# Altium footprint library 1.01-电阻.PcbLib: 78 footprints (part 2 of 5)
Each footprint in its own frame and in the unit in brackets; x right, y up, seen from the top. Pads: shape width x height; smd on the part's side, far side on the other; paste and mask are expansions set on the pad; w line width, h text height; cw(c..) or ccw(c..) is an arc to the next point about the centre after c.
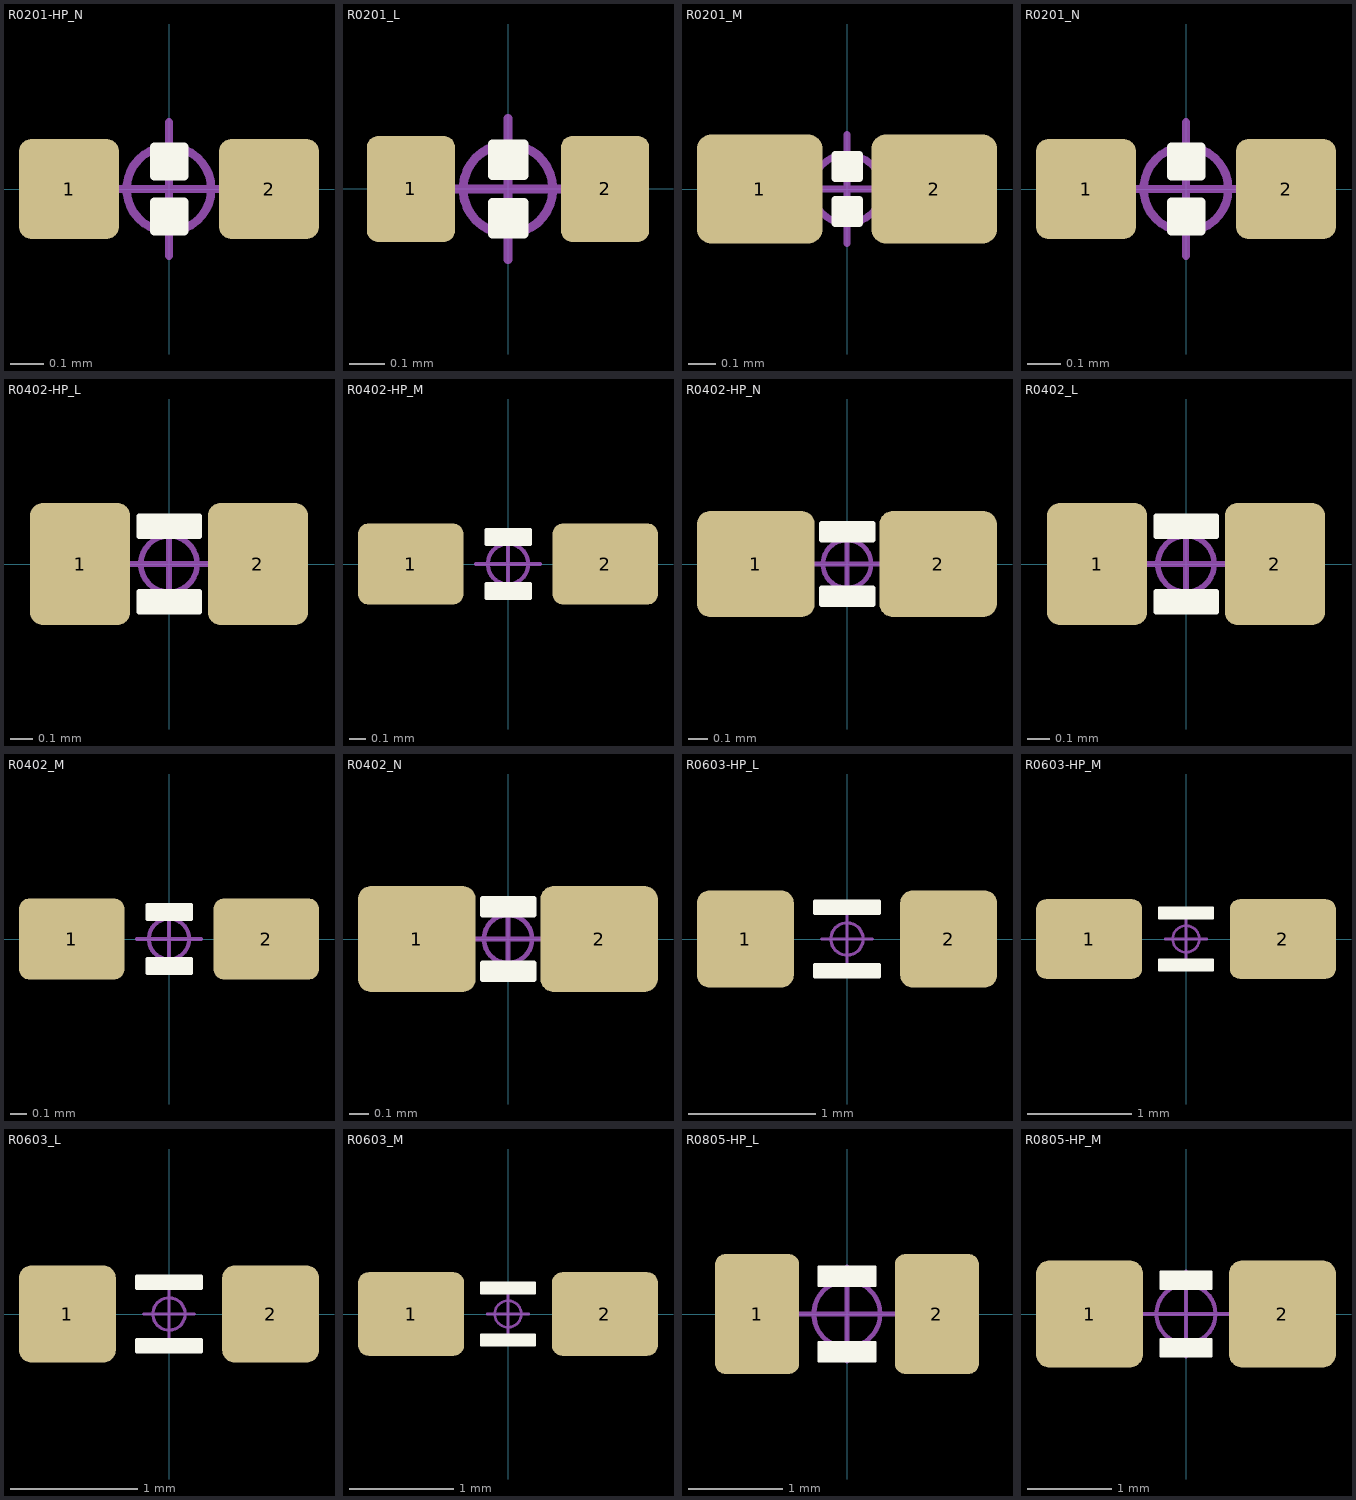
[diagram p1: the footprints below, top view; thin cyan lines are the x and y axes]

## R0201-HP_N [mm] "1/20W高精度贴片电阻"
pads (2):
  rrect25% 0.3x0.3 smd: 1(-0.3,0) 2(0.3,0)
Top Overlay:
  region: -0.044,-0.127 -0.044,-0.038 0.045,-0.038 0.045,-0.127
  region: -0.044,0.038 -0.044,0.127 0.045,0.127 0.045,0.038
  lines w0.025: -0.044,-0.127 0.045,-0.127 0.045,-0.038 -0.044,-0.038 -0.044,-0.127 ; -0.044,0.038 0.045,0.038 0.045,0.127 -0.044,0.127 -0.044,0.038
Mechanical 15:
  circle w0.025: c0,0 r0.127
  lines w0.025: -0.2,0 0.2,0 ; 0,-0.2 0,0.2
3D body "R0201-HP.STEP": height 0.23, standoff 0, extent -0.3,-0.15 0.3,0.15

## R0201_L [mm] "1/20W贴片电阻"
pads (2):
  rrect25% 0.25x0.3 smd: 1(-0.275,0) 2(0.275,0)
Top Overlay:
  region: -0.044,0.038 -0.044,0.127 0.045,0.127 0.045,0.038
  region: -0.044,-0.127 -0.044,-0.038 0.045,-0.038 0.045,-0.127
  lines w0.025: -0.044,-0.127 -0.044,-0.038 0.045,-0.038 0.045,-0.127 -0.044,-0.127 ; -0.044,0.038 -0.044,0.127 0.045,0.127 0.045,0.038 -0.044,0.038
Mechanical 15:
  circle w0.025: c0,0 r0.127
  lines w0.025: -0.2,0 0.2,0 ; 0,-0.2 0,0.2
3D body "R0201.STEP": height 0.26, standoff 0.03, extent -0.3,-0.152 0.3,0.148

## R0201_M [mm] "1/20W贴片电阻"
pads (2):
  rrect25% 0.46x0.4 smd: 1(-0.32,0) 2(0.32,0)
Top Overlay:
  region: -0.044,0.038 -0.044,0.127 0.045,0.127 0.045,0.038
  region: -0.044,-0.127 -0.044,-0.038 0.045,-0.038 0.045,-0.127
  lines w0.025: -0.044,-0.127 -0.044,-0.038 0.045,-0.038 0.045,-0.127 -0.044,-0.127 ; -0.044,0.038 -0.044,0.127 0.045,0.127 0.045,0.038 -0.044,0.038
Mechanical 15:
  circle w0.025: c0,0 r0.127
  lines w0.025: -0.2,0 0.2,0 ; 0,-0.2 0,0.2
3D body "R0201.STEP": height 0.26, standoff 0.03, extent -0.3,-0.15 0.3,0.15

## R0201_N [mm] "1/20W贴片电阻"
pads (2):
  rrect25% 0.3x0.3 smd: 1(-0.3,0) 2(0.3,0)
Top Overlay:
  region: -0.044,0.038 -0.044,0.127 0.045,0.127 0.045,0.038
  region: -0.044,-0.127 -0.044,-0.038 0.045,-0.038 0.045,-0.127
  lines w0.025: -0.044,-0.127 -0.044,-0.038 0.045,-0.038 0.045,-0.127 -0.044,-0.127 ; -0.044,0.038 -0.044,0.127 0.045,0.127 0.045,0.038 -0.044,0.038
Mechanical 15:
  circle w0.025: c0,0 r0.127
  lines w0.025: -0.2,0 0.2,0 ; 0,-0.2 0,0.2
3D body "R0201.STEP": height 0.26, standoff 0.03, extent -0.3,-0.15 0.3,0.15

## R0402-HP_L [mm] "1/16W高精度贴片电阻"
pads (2):
  rrect25% 0.45x0.55 smd: 1(-0.4,0) 2(0.4,0)
Top Overlay:
  region: -0.134,-0.214 -0.134,-0.125 0.136,-0.125 0.136,-0.214
  region: -0.134,0.125 0.136,0.125 0.136,0.214 -0.134,0.214
  lines w0.025: -0.134,-0.214 -0.134,-0.125 0.136,-0.125 0.136,-0.214 -0.134,-0.214 ; -0.134,0.125 0.136,0.125 0.136,0.214 -0.134,0.214 -0.134,0.125
Mechanical 15:
  circle w0.025: c0,0 r0.127
  lines w0.025: -0.2,0 0.2,0 ; 0,-0.2 0,0.2
3D body "R0402-HP.STEP": height 0.3, standoff 0, extent -0.5,-0.25 0.5,0.25

## R0402-HP_M [mil] "1/16W高精度贴片电阻"
pads (2):
  rrect25% 26x20 smd: 1(-24,0) 2(24,0)
Top Overlay:
  region: -5.28,-8.44 -5.28,-4.94 5.37,-4.94 5.37,-8.44
  region: -5.28,4.94 5.37,4.94 5.37,8.44 -5.28,8.44
  lines w1: -5.28,-8.44 -5.28,-4.94 5.37,-4.94 5.37,-8.44 -5.28,-8.44 ; -5.28,4.94 5.37,4.94 5.37,8.44 -5.28,8.44 -5.28,4.94
Mechanical 15:
  circle w1: c0,0 r5
  lines w1: -7.87,0 7.87,0 ; 0,-7.87 0,7.87
3D body "R0402-HP.STEP": height 11.85, standoff 0, extent -19.68,-9.84 19.69,9.85

## R0402-HP_N [mm] "1/16W高精度贴片电阻"
pads (2):
  rrect25% 0.62x0.56 smd: 1(-0.48,0)
  rrect26% 0.62x0.56 smd: 2(0.48,0)
Top Overlay:
  region: -0.134,0.125 0.136,0.125 0.136,0.214 -0.134,0.214
  region: -0.134,-0.214 -0.134,-0.125 0.136,-0.125 0.136,-0.214
  lines w0.025: -0.134,-0.214 0.136,-0.214 0.136,-0.125 -0.134,-0.125 -0.134,-0.214 ; -0.134,0.125 -0.134,0.214 0.136,0.214 0.136,0.125 -0.134,0.125
Mechanical 15:
  circle w0.025: c0,0 r0.127
  lines w0.025: -0.2,0 0.2,0 ; 0,-0.2 0,0.2
3D body "R0402-HP.STEP": height 0.3, standoff 0, extent -0.5,-0.25 0.5,0.25

## R0402_L [mm] "1/16W贴片电阻"
pads (2):
  rrect25% 0.45x0.55 smd: 1(-0.4,0) 2(0.4,0)
Top Overlay:
  region: -0.134,-0.214 -0.134,-0.125 0.136,-0.125 0.136,-0.214
  region: -0.134,0.125 0.136,0.125 0.136,0.214 -0.134,0.214
  lines w0.025: -0.134,-0.214 -0.134,-0.125 0.136,-0.125 0.136,-0.214 -0.134,-0.214 ; -0.134,0.125 0.136,0.125 0.136,0.214 -0.134,0.214 -0.134,0.125
Mechanical 15:
  circle w0.025: c0,0 r0.127
  lines w0.025: -0.2,0 0.2,0 ; 0,-0.2 0,0.2
3D body "R0402.STEP": height 0.3, standoff 0, extent -0.5,-0.25 0.5,0.25

## R0402_M [mil] "1/16W贴片电阻"
pads (2):
  rrect25% 26x20 smd: 1(-24,0) 2(24,0)
Top Overlay:
  region: -5.28,-8.44 -5.28,-4.94 5.37,-4.94 5.37,-8.44
  region: -5.28,4.94 5.37,4.94 5.37,8.44 -5.28,8.44
  lines w1: -5.28,-8.44 -5.28,-4.94 5.37,-4.94 5.37,-8.44 -5.28,-8.44 ; -5.28,4.94 5.37,4.94 5.37,8.44 -5.28,8.44 -5.28,4.94
Mechanical 15:
  circle w1: c0,0 r5
  lines w1: -7.87,0 7.87,0 ; 0,-7.87 0,7.87
3D body "R0402.STEP": height 11.85, standoff 0, extent -19.68,-9.84 19.69,9.85

## R0402_N [mm] "1/16W贴片电阻"
pads (2):
  rrect25% 0.62x0.56 smd: 1(-0.48,0)
  rrect26% 0.62x0.56 smd: 2(0.48,0)
Top Overlay:
  region: -0.134,0.125 0.136,0.125 0.136,0.214 -0.134,0.214
  region: -0.134,-0.214 -0.134,-0.125 0.136,-0.125 0.136,-0.214
  lines w0.025: -0.134,-0.214 0.136,-0.214 0.136,-0.125 -0.134,-0.125 -0.134,-0.214 ; -0.134,0.125 -0.134,0.214 0.136,0.214 0.136,0.125 -0.134,0.125
Mechanical 15:
  circle w0.025: c0,0 r0.127
  lines w0.025: -0.2,0 0.2,0 ; 0,-0.2 0,0.2
3D body "R0402.STEP": height 0.3, standoff 0, extent -0.5,-0.25 0.5,0.25

## R0603-HP_L [mil] "1/10W高精度贴片电阻"
pads (2):
  rrect25% 30x30 smd: 1(-31.5,0) 2(31.5,0)
Top Overlay:
  region: -10.07,7.87 10.07,7.87 10.07,11.81 -10.07,11.81
  region: -10.07,-11.81 10.07,-11.81 10.07,-7.87 -10.07,-7.87
  lines w1: -10.07,-11.81 -10.07,-7.87 0,-7.87 10.07,-7.87 10.07,-11.81 0,-11.81 -10.07,-11.81 ; -10.07,7.87 0,7.87 10.07,7.87 10.07,11.81 0,11.81 -10.07,11.81 -10.07,7.87
Mechanical 15:
  circle w1: c0,0 r5
  lines w1: -7.87,0 7.87,0 ; 0,-7.87 0,7.87
3D body "R0603-HP.STEP": height 15.79, standoff 0, extent -31.49,-15.74 31.5,15.75

## R0603-HP_M [mil] "1/10W高精度贴片电阻"
pads (2):
  rrect25% 40x30 smd: 1(-36.5,0) 2(36.5,0)
Top Overlay:
  region: -10.07,-11.81 10.07,-11.81 10.07,-7.87 -10.07,-7.87
  region: -10.07,7.87 10.07,7.87 10.07,11.81 -10.07,11.81
  lines w1: -10.07,-11.81 0,-11.81 10.07,-11.81 10.07,-7.87 0,-7.87 -10.07,-7.87 -10.07,-11.81 ; -10.07,7.87 -10.07,11.81 0,11.81 10.07,11.81 10.07,7.87 0,7.87 -10.07,7.87
Mechanical 15:
  circle w1: c0,0 r5
  lines w1: -7.87,0 7.87,0 ; 0,-7.87 0,7.87
3D body "R0603-HP.STEP": height 15.79, standoff 0, extent -31.49,-15.74 31.5,15.75

## R0603_L [mil] "1/10W贴片电阻"
pads (2):
  rrect25% 30x30 smd: 1(-31.5,0) 2(31.5,0)
Top Overlay:
  region: -10.07,-11.81 10.07,-11.81 10.07,-7.87 -10.07,-7.87
  region: -10.07,7.87 10.07,7.87 10.07,11.81 -10.07,11.81
  lines w1: -10.07,-11.81 0,-11.81 10.07,-11.81 10.07,-7.87 0,-7.87 -10.07,-7.87 -10.07,-11.81 ; -10.07,7.87 -10.07,11.81 0,11.81 10.07,11.81 10.07,7.87 0,7.87 -10.07,7.87
Mechanical 15:
  circle w1: c0,0 r5
  lines w1: -7.87,0 7.87,0 ; 0,-7.87 0,7.87
3D body "R0603.STEP": height 15.79, standoff 0, extent -31.49,-15.74 31.5,15.75

## R0603_M [mil] "1/10W贴片电阻"
pads (2):
  rrect25% 40x31.5 smd: 1(-36.5,0) 2(36.5,0)
Top Overlay:
  region: -10.07,-11.81 10.07,-11.81 10.07,-7.87 -10.07,-7.87
  region: -10.07,7.87 10.07,7.87 10.07,11.81 -10.07,11.81
  lines w1: -10.07,-11.81 0,-11.81 10.07,-11.81 10.07,-7.87 0,-7.87 -10.07,-7.87 -10.07,-11.81 ; -10.07,7.87 -10.07,11.81 0,11.81 10.07,11.81 10.07,7.87 0,7.87 -10.07,7.87
Mechanical 15:
  circle w1: c0,0 r5
  lines w1: -7.87,0 7.87,0 ; 0,-7.87 0,7.87
3D body "R0603.STEP": height 15.79, standoff 0, extent -31.49,-15.74 31.5,15.75

## R0805-HP_L [mm] "1/8W高精度贴片电阻"
pads (2):
  rrect25% 0.889x1.27 smd: 1(-0.95,0) 2(0.95,0)
Top Overlay:
  region: 0.3,0.5 0.3,0.3 -0.3,0.3 -0.3,0.5
  region: -0.3,-0.5 -0.3,-0.3 0.3,-0.3 0.3,-0.5
  lines w0.025: -0.3,-0.5 -0.3,-0.3 0.1,-0.3 0.3,-0.3 0.3,-0.5 0,-0.5 -0.3,-0.5 ; -0.3,0.3 -0.1,0.3 0.3,0.3 0.3,0.5 0,0.5 -0.3,0.5 -0.3,0.3
Mechanical 15:
  circle w0.05: c0,0 r0.35
  lines w0.05: -0.5,0 0.5,0 ; 0,-0.5 0,0.5
3D body "R0805-HP.STEP": height 0.53, standoff 0.03, extent -1,-0.625 1,0.625

## R0805-HP_M [mil] "1/8W高精度贴片电阻"
pads (2):
  rrect25% 50x50 smd: 1(-45,0) 2(45,0)
Top Overlay:
  region: 11.81,19.68 11.81,11.81 -11.81,11.81 -11.81,19.68
  region: -11.81,-19.68 -11.81,-11.81 11.81,-11.81 11.81,-19.68
  lines w1: -11.81,-19.68 -11.81,-11.81 3.94,-11.81 11.81,-11.81 11.81,-19.68 0,-19.68 -11.81,-19.68 ; -11.81,11.81 -3.94,11.81 11.81,11.81 11.81,19.68 0,19.68 -11.81,19.68 -11.81,11.81
Mechanical 15:
  circle w1.97: c0,0 r13.78
  lines w1.97: -19.68,0 19.68,0 ; 0,-19.68 0,19.68
3D body "R0805-HP.STEP": height 20.72, standoff 1, extent -39.36,-24.6 39.38,24.61